# Altium footprint library Evaluation Board.PcbLib: 121 footprints (part 4 of 8)
Each footprint in its own frame and in the unit in brackets; x right, y up, seen from the top. Pads: shape width x height; smd on the part's side, far side on the other; paste and mask are expansions set on the pad; w line width, h text height; cw(c..) or ccw(c..) is an arc to the next point about the centre after c.
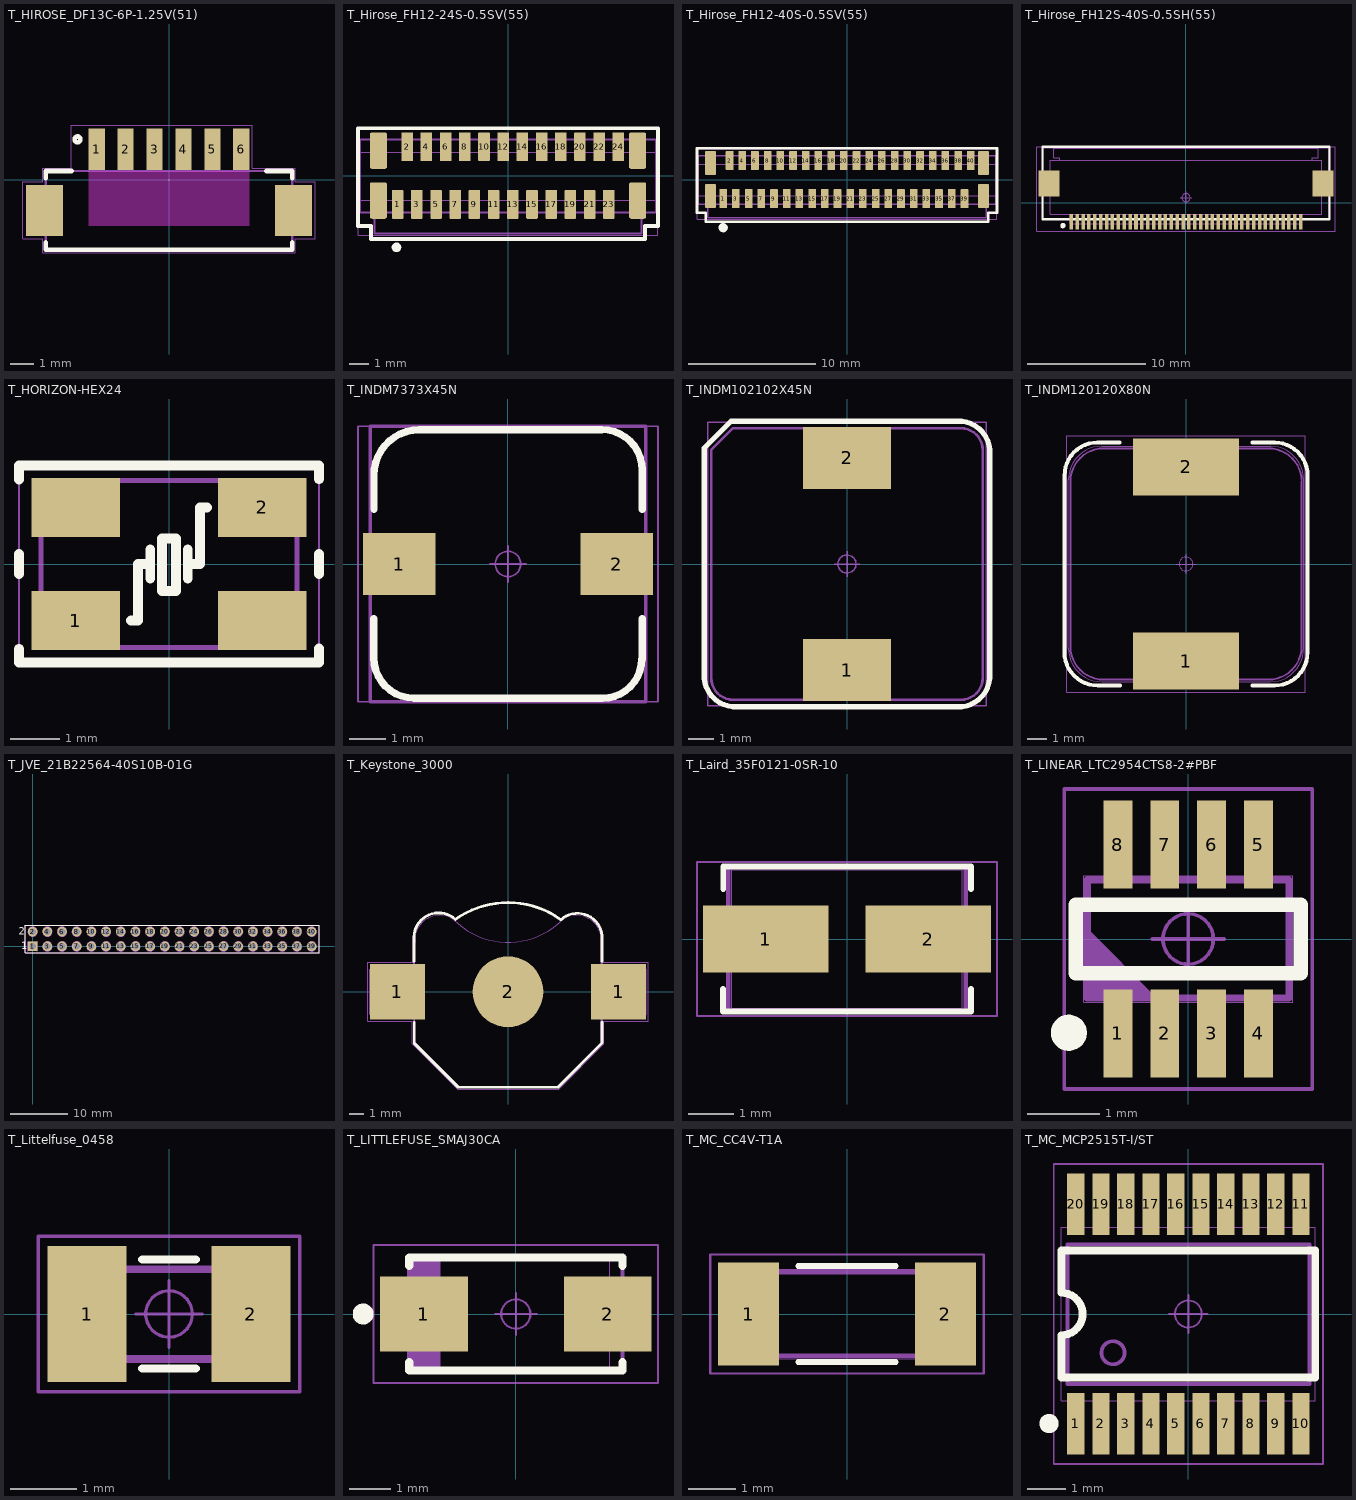
[diagram p3: the footprints below, top view; thin cyan lines are the x and y axes]

## T_HIROSE_DF13C-6P-1.25V(51) [mm] "Touch connector"
height 4.8
pads (8):
  rect 0.7x1.8 smd: 1(-3.125,1.324) 2(-1.875,1.324) 3(-0.625,1.324) 4(0.625,1.324) 5(1.875,1.324) 6(3.125,1.324)
  rect 1.6x2.2 smd: ""(-5.385,-1.324) ""(5.385,-1.324)
Top Overlay:
  circle w0.2: c-3.955,1.744 r0.125
  lines w0.2: -5.325,-2.713 -5.325,-3.024 5.325,-3.024 5.325,-2.713 ; -5.325,0.064 -5.325,0.376 -4.201,0.376 ; 4.201,0.376 5.325,0.376 5.325,0.064
Keep-Out Layer:
  rectangle: -3.475,-1.994 3.475,0.376
Mechanical 1:
  lines w0.05: -6.316,-2.555 -5.456,-2.555 -5.456,-3.155 5.456,-3.155 5.456,-2.555 6.316,-2.555 6.316,-0.093 5.456,-0.092 5.456,0.507 3.606,0.507 3.606,2.354 -4.226,2.354 -4.226,0.506 -5.456,0.506 -5.456,-0.093 -6.316,-0.093 -6.316,-2.555
Mechanical 2:
  lines w0.001: -5.325,-2.224 -6.075,-2.224 -6.075,-0.424 -5.325,-0.424 ; 5.325,-2.224 6.075,-2.224 6.075,-0.424 5.325,-0.424 ; -5.325,-3.024 5.325,-3.024 5.325,0.376 -5.325,0.376 -5.325,-3.024
Mechanical 3:
  lines w0.1: -5.325,-3.024 5.325,-3.024 5.325,0.376 -5.325,0.376 -5.325,-3.024

## T_Hirose_FH12-24S-0.5SV(55) [mm] "FFC Connector 0.5mm pitch Vertical"
height 5.5
pads (28):
  rrect12% 0.6x1.5 smd: 1(-5.75,-1.5) 2(-5.25,1.5) 3(-4.75,-1.5) 4(-4.25,1.5) 5(-3.75,-1.5) 6(-3.25,1.5) 7(-2.75,-1.5) 8(-2.25,1.5) 9(-1.75,-1.5) 10(-1.25,1.5) 11(-0.75,-1.5) 12(-0.25,1.5) 13(0.25,-1.5) 14(0.75,1.5) 15(1.25,-1.5) 16(1.75,1.5) 17(2.25,-1.5) 18(2.75,1.5) 19(3.25,-1.5) 20(3.75,1.5) 21(4.25,-1.5) 22(4.75,1.5) 23(5.25,-1.5) 24(5.75,1.5)
  rrect25% 0.9x1.9 smd: ""(-6.75,-1.3) ""(-6.75,1.3) ""(6.75,-1.3) ""(6.75,1.3)
Top Overlay:
  circle w0.25: c-5.81,-3.738 r0.125
  lines w0.2: -7.814,-2.625 -7.814,2.464 7.814,2.464 7.814,-2.625 7.132,-2.625 7.132,-3.307 -7.132,-3.307 -7.132,-2.625 -7.814,-2.625
Mechanical 1:
  lines w0.05: -7.8,-3.116 7.8,-3.116 7.8,2.416 -7.8,2.416 -7.8,-3.116
Mechanical 2:
  lines w0.001: -7.7,-1.275 7.7,-1.275 ; -7.7,1.225 7.7,1.225 ; -6.95,-1.925 -6.95,-3.025 6.95,-3.025 6.95,-1.925 ; -7.7,-1.925 7.7,-1.925 7.7,1.875 -7.7,1.875 -7.7,-1.925
Mechanical 3:
  lines w0.1: -6.95,-1.925 -6.95,-3.025 6.95,-3.025 6.95,-1.925 ; -7.7,-1.925 7.7,-1.925 7.7,1.875 -7.7,1.875 -7.7,-1.925
3D body "FH12-24S-0.5SV.stp": height 5.52, standoff 0.02, extent -7.7,-1.925 7.7,1.875

## T_Hirose_FH12-40S-0.5SV(55) [mm] "FFC Connector 0.5mm pitch Vertical"
height 5.5
pads (44):
  rrect12% 0.6x1.5 smd: 1(-9.75,-1.5) 2(-9.25,1.5) 3(-8.75,-1.5) 4(-8.25,1.5) 5(-7.75,-1.5) 6(-7.25,1.5) 7(-6.75,-1.5) 8(-6.25,1.5) 9(-5.75,-1.5) 10(-5.25,1.5) 11(-4.75,-1.5) 12(-4.25,1.5) 13(-3.75,-1.5) 14(-3.25,1.5) 15(-2.75,-1.5) 16(-2.25,1.5) 17(-1.75,-1.5) 18(-1.25,1.5) 19(-0.75,-1.5) 20(-0.25,1.5) 21(0.25,-1.5) 22(0.75,1.5) 23(1.25,-1.5) 24(1.75,1.5) 25(2.25,-1.5) 26(2.75,1.5) 27(3.25,-1.5) 28(3.75,1.5) 29(4.25,-1.5) 30(4.75,1.5) 31(5.25,-1.5) 32(5.75,1.5) 33(6.25,-1.5) 34(6.75,1.5) 35(7.25,-1.5) 36(7.75,1.5) 37(8.25,-1.5) 38(8.75,1.5) 39(9.25,-1.5) 40(9.75,1.5)
  rrect25% 0.9x1.9 smd: ""(-10.75,-1.3) ""(-10.75,1.3) ""(10.75,-1.3) ""(10.75,1.3)
Top Overlay:
  circle w0.4: c-9.75,-3.79 r0.16
  lines w0.2: 11.13,-3.307 -11.132,-3.307 -11.132,-2.625 -11.814,-2.625 -11.814,2.464 11.814,2.464 11.814,-2.625 11.132,-2.625 11.132,-3.307
Mechanical 1:
  lines w0.05: -11.8,-3.116 11.8,-3.116 11.8,2.416 -11.8,2.416 -11.8,-3.116
Mechanical 2:
  lines w0.001: -11.7,-1.275 11.7,-1.275 ; -11.7,1.225 11.7,1.225 ; -10.95,-1.925 -10.95,-3.025 10.95,-3.025 10.95,-1.925 ; -11.7,-1.925 11.7,-1.925 11.7,1.875 -11.7,1.875 -11.7,-1.925
Mechanical 3:
  lines w0.1: -10.95,-1.925 -10.95,-3.025 10.95,-3.025 10.95,-1.925 ; -11.7,-1.925 11.7,-1.925 11.7,1.875 -11.7,1.875 -11.7,-1.925
3D body "FH12-40S-0.5SV.stp": height 5.52, standoff 0.02, extent -11.7,-1.925 11.7,1.875

## T_Hirose_FH12S-40S-0.5SH(55) [mm] "DVI FFC Connector 0.5mm pitch"
height 2
pads (42):
  rect 0.3x1.3 smd: 1(-9.75,-1.625) 2(-9.25,-1.625) 3(-8.75,-1.625) 4(-8.25,-1.625) 5(-7.75,-1.625) 6(-7.25,-1.625) 7(-6.75,-1.625) 8(-6.25,-1.625) 9(-5.75,-1.625) 10(-5.25,-1.625) 11(-4.75,-1.625) 12(-4.25,-1.625) 13(-3.75,-1.625) 14(-3.25,-1.625) 15(-2.75,-1.625) 16(-2.25,-1.625) 17(-1.75,-1.625) 18(-1.25,-1.625) 19(-0.75,-1.625) 20(-0.25,-1.625) 21(0.25,-1.625) 22(0.75,-1.625) 23(1.25,-1.625) 24(1.75,-1.625) 25(2.25,-1.625) 26(2.75,-1.625) 27(3.25,-1.625) 28(3.75,-1.625) 29(4.25,-1.625) 30(4.75,-1.625) 31(5.25,-1.625) 32(5.75,-1.625) 33(6.25,-1.625) 34(6.75,-1.625) 35(7.25,-1.625) 36(7.75,-1.625) 37(8.25,-1.625) 38(8.75,-1.625) 39(9.25,-1.625) 40(9.75,-1.625)
  rect 1.8x2.2 smd: ""(-11.65,1.625) ""(11.65,1.625)
Top Overlay:
  circle w0.2: c-10.459,-1.944 r0.125
  lines w0.2: -12.198,-1.411 -12.198,4.755 12.193,4.755 12.193,-1.411 -12.198,-1.411
Mechanical 1:
  circle w0.05: c0,0.425 r0.35
  lines w0.05: -0.5,0.425 0.5,0.425 ; 0,-0.075 0,0.925 ; -12.69,-2.415 -12.69,4.755 12.69,4.755 12.69,-2.415 -12.69,-2.415
Mechanical 2:
  lines w0.001: -10.75,3.625 -10.75,3.825 -11.25,3.825 -11.25,4.625 11.25,4.625 11.25,3.825 10.75,3.825 10.75,3.625 ; -9.85,-0.975 -9.85,-1.775 9.85,-1.775 9.85,-0.975 ; -12.05,1.025 -12.05,2.225 -11.55,2.225 -11.55,3.625 11.55,3.625 11.55,2.225 12.05,2.225 12.05,1.025 11.55,1.025 11.55,-0.975 -11.55,-0.975 -11.55,1.025 -12.05,1.025
Mechanical 3:
  lines w0.1: -12.125,-1.336 -12.125,4.689 12.12,4.689 12.12,-1.336 -12.125,-1.336

## T_HORIZON-HEX24 [mm] "OSC"
height 0.9
pads (4):
  rect 1.8x1.2 smd: 1(-1.9,-1.15) 2(1.9,1.15) ""(-1.9,1.15) ""(1.9,-1.15)
Top Overlay:
  lines w0.2: -3.05,-1.722 -3.05,-2.001 3.05,-2.001 ; -3.05,-0.2 -3.05,0.2 ; -3.05,1.72 -3.05,1.999 ; -3.05,2.001 3.05,2.001 3.05,1.722 ; -0.77,-1.15 -0.63,-1.15 -0.63,0 -0.38,0 ; -0.38,-0.3 -0.38,0.3 ; 0.38,-0.3 0.38,0.3 ; 0.38,0 0.63,0 0.63,1.15 0.77,1.15 ; 3.05,-1.999 3.05,-1.72 ; 3.05,-0.2 3.05,0.2 ; -0.14,-0.55 -0.14,0.52 0.14,0.52 0.14,-0.55 -0.14,-0.55
Mechanical 1:
  lines w0.05: -3.05,-2.001 3.05,-2.001 3.05,2.001 -3.05,2.001 -3.05,-2.001
Mechanical 2:
  lines w0.001: -2.6,-1.7 2.6,-1.7 2.6,1.7 -2.6,1.7 -2.6,-1.7
Mechanical 3:
  lines w0.1: -2.6,-1.7 2.6,-1.7 2.6,1.7 -2.6,1.7 -2.6,-1.7
3D body: height 0.9, standoff 0, extent -2.6,-1.7 2.6,1.7

## T_INDM7373X45N [mm]
height 4.5
pads (2):
  rect 2x1.7 smd: 1(-3,0) 2(3,0)
Top Overlay:
  lines w0.2: -3.7,-1.5 -3.7,-2.59 ccw(c-2.594,-2.59) -2.594,-3.697 ; -3.696,1.5 -3.696,2.6 ; -3.696,2.452 cw(c-2.448,2.452) -2.448,3.7 2.588,3.7 ; -2.594,-3.7 2.609,-3.7 ccw(c2.609,-2.623) 3.686,-2.623 ; 2.588,3.708 cw(c2.588,2.596) 3.7,2.596 ; 3.7,-2.623 3.7,-1.5 ; 3.7,1.5 3.7,2.6
Mechanical 1:
  circle w0.05: c0,0 r0.35
  lines w0.05: -0.5,0 0.5,0 ; 0,-0.5 0,0.5 ; -4.135,-3.8 4.136,-3.8 4.136,3.8 -4.135,3.8 -4.135,-3.8
Mechanical 2:
  lines w0.001: -3.8,-3.8 3.8,-3.8 3.8,3.8 -3.8,3.8 -3.8,-3.8
Mechanical 3:
  lines w0.1: -3.8,-3.8 3.8,-3.8 3.8,3.8 -3.8,3.8 -3.8,-3.8

## T_INDM102102X45N [mm]
height 4.5
pads (2):
  rect 3.4x2.4 smd: 1(0,-4.1) 2(0,4.1)
Top Overlay:
  lines w0.2: 4.24,-5.52 ccw(c4.32,-4.32) 5.52,-4.4 5.52,4.4 ; 4.4,-5.52 -4.4,-5.52 cw(c-4.32,-4.32) -5.52,-4.24 -5.52,4.49 -4.49,5.52 4.24,5.52 cw(c4.32,4.32) 5.52,4.24
Mechanical 1:
  circle w0.05: c0,0 r0.35
  lines w0.05: -0.5,0 0.5,0 ; 0,-0.5 0,0.5 ; -5.38,-5.48 -5.38,5.48 5.38,5.48 5.38,-5.48 -5.38,-5.48
Mechanical 2:
  lines w0.001: -5.25,-4.4 ccw(c-4.4,-4.4) -4.4,-5.25 4.4,-5.25 ccw(c4.4,-4.4) 5.25,-4.4 5.25,4.4 ccw(c4.4,4.4) 4.4,5.25 -4.4,5.25 -5.25,4.4 -5.25,-4.4
Mechanical 3:
  lines w0.1: -5.25,-4.4 ccw(c-4.4,-4.4) -4.4,-5.25 4.4,-5.25 ccw(c4.4,-4.4) 5.25,-4.4 5.25,4.4 ccw(c4.4,4.4) 4.4,5.25 -4.4,5.25 -5.25,4.4 -5.25,-4.4
3D body: height 4.5, standoff 0, extent -5.25,-5.25 5.25,5.25

## T_INDM120120X80N [mm]
height 6
pads (2):
  rect 5.4x2.9 smd: 1(0,-4.95) 2(0,4.95)
Top Overlay:
  lines w0.2: -6.204,-4.492 ccw(c-4.496,-4.492) -4.496,-6.2 -3.373,-6.2 ; -6.2,-4.492 -6.2,4.516 ; -6.196,4.516 cw(c-4.513,4.516) -4.513,6.2 -3.39,6.2 ; 3.382,-6.2 4.505,-6.2 ccw(c4.505,-4.509) 6.196,-4.509 ; 3.393,6.196 4.516,6.196 cw(c4.516,4.512) 6.2,4.512 6.2,-4.509
Mechanical 1:
  circle w0.05: c0,0 r0.35
  lines w0.05: -0.5,0 0.5,0 ; 0,-0.5 0,0.5 ; -6.08,-6.535 -6.08,6.535 6.08,6.535 6.08,-6.535 -6.08,-6.535
Mechanical 2:
  lines w0.001: -6,-4.299 ccw(c-4.299,-4.299) -4.3,-6 ; -6,4.3 cw(c-4.299,4.299) -4.299,6 ; -6,-4.302 -6,4.303 ; -4.303,6 4.322,6 ; -4.302,-6 4.304,-6 ; 4.299,-6 ccw(c4.299,-4.299) 6,-4.3 ; 4.3,6 cw(c4.299,4.299) 6,4.299 ; 6,-4.313 6,4.322
Mechanical 3:
  lines w0.1: -5.901,-4.198 ccw(c-4.2,-4.198) -4.201,-5.899 ; -5.9,-4.21 -5.9,4.2 ; -5.899,4.201 cw(c-4.198,4.2) -4.198,5.901 ; -4.21,-5.9 4.21,-5.9 ; -4.2,5.9 4.2,5.9 ; 4.198,-5.901 ccw(c4.198,-4.2) 5.899,-4.201 ; 4.201,5.899 cw(c4.2,4.198) 5.901,4.198 ; 5.9,-4.21 5.9,4.2
3D body: height 6, standoff 0, extent -6,-6 6,6

## T_JVE_21B22564-40S10B-01G [mm] "Header 2x20"
height 8.6
pads (40):
  rect 1.65x1.65 hole 1.15: 1(0,0)
  round 1.65 hole 1.15: 2(0,2.54) 3(2.54,0) 4(2.54,2.54) 5(5.08,0) 6(5.08,2.54) 7(7.62,0) 8(7.62,2.54) 9(10.16,0) 10(10.16,2.54) 11(12.7,0) 12(12.7,2.54) 13(15.24,0) 14(15.24,2.54) 15(17.78,0) 16(17.78,2.54) 17(20.32,0) 18(20.32,2.54) 19(22.86,0) 20(22.86,2.54) 21(25.4,0) 22(25.4,2.54) 23(27.94,0) 24(27.94,2.54) 25(30.48,0) 26(30.48,2.54) 27(33.02,0) 28(33.02,2.54) 29(35.56,0) 30(35.56,2.54) 31(38.1,0) 32(38.1,2.54) 33(40.64,0) 34(40.64,2.54) 35(43.18,0) 36(43.18,2.54) 37(45.72,0) 38(45.72,2.54) 39(48.26,0) 40(48.26,2.54)
Top Overlay:
  lines w0.2: -1.27,-1.14 49.53,-1.14 49.53,3.68 -1.27,3.68 -1.27,-1.137
  text "1" at -1.941,-0.522 h1.27
  text "2" at -2.364,2.048 h1.27
Mechanical 1:
  circle w0.05: c0,0 r0.35
  lines w0.05: -1.27,-1.14 49.53,-1.14 49.53,3.68 -1.27,3.68 -1.27,-1.137 ; -0.5,0 0.5,0 ; 0,-0.5 0,0.5
Mechanical 2:
  lines w0.001: -1.27,-1.14 -1.27,3.68 49.53,3.68 49.53,-1.14 -1.27,-1.14
Mechanical 3:
  circle w0.1: c48.26,2.54 r0.825
  circle w0.1: c48.26,0 r0.825
  circle w0.1: c45.72,2.54 r0.825
  circle w0.1: c45.72,0 r0.825
  circle w0.1: c43.18,2.54 r0.825
  circle w0.1: c43.18,0 r0.825
  circle w0.1: c40.64,2.54 r0.825
  circle w0.1: c40.64,0 r0.825
  circle w0.1: c38.1,2.54 r0.825
  circle w0.1: c38.1,0 r0.825
  circle w0.1: c35.56,2.54 r0.825
  circle w0.1: c35.56,0 r0.825
  circle w0.1: c33.02,2.54 r0.825
  circle w0.1: c33.02,0 r0.825
  circle w0.1: c30.48,2.54 r0.825
  circle w0.1: c30.48,0 r0.825
  circle w0.1: c27.94,2.54 r0.825
  circle w0.1: c27.94,0 r0.825
  circle w0.1: c25.4,2.54 r0.825
  circle w0.1: c25.4,0 r0.825
  circle w0.1: c22.86,2.54 r0.825
  circle w0.1: c22.86,0 r0.825
  circle w0.1: c20.32,2.54 r0.825
  circle w0.1: c20.32,0 r0.825
  circle w0.1: c17.78,2.54 r0.825
  circle w0.1: c17.78,0 r0.825
  circle w0.1: c15.24,2.54 r0.825
  circle w0.1: c15.24,0 r0.825
  circle w0.1: c12.7,2.54 r0.825
  circle w0.1: c12.7,0 r0.825
  circle w0.1: c10.16,2.54 r0.825
  circle w0.1: c10.16,0 r0.825
  circle w0.1: c7.62,2.54 r0.825
  circle w0.1: c7.62,0 r0.825
  circle w0.1: c5.08,2.54 r0.825
  circle w0.1: c5.08,0 r0.825
  circle w0.1: c2.54,2.54 r0.825
  circle w0.1: c2.54,0 r0.825
  circle w0.1: c0,2.54 r0.825
  lines w0.1: -1.27,-1.14 49.53,-1.14 49.53,3.68 -1.27,3.68 -1.27,-1.137 ; -0.825,-0.825 -0.825,0.825 0.825,0.825 0.825,-0.825

## T_Keystone_3000 [mm] "Battery Holder"
height 3.2
pads (3):
  rect 3.9x3.9 smd: 1(-7.82,0) 1(7.82,0)
  round 5 smd mask+0: 2(0,0)
Top Overlay:
  lines w0.2: -6.653,2.153 -6.653,3.928 ; -6.653,3.668 cw(c-4.903,3.818) -3.718,5.115 ; -6.631,-2.152 -6.631,-3.638 -3.517,-6.752 3.523,-6.752 6.651,-3.624 6.651,-2.152 ; -3.716,5.117 cw(c0,-0.1) 3.736,5.103 ; 3.736,5.102 cw(c4.906,3.792) 6.654,3.965 6.654,2.152
Mechanical 1:
  lines w0.05: -6.697,3.669 cw(c-4.947,3.819) -3.753,5.107 ; -6.697,3.972 -6.697,2.091 -9.911,2.091 -9.911,-2.09 -6.757,-2.09 -6.757,-3.642 -6.757,-3.691 -3.57,-6.878 3.574,-6.878 6.776,-3.676 6.776,-2.091 8.247,-2.091 9.91,-2.091 9.91,2.091 6.689,2.091 6.689,4 ; -3.745,5.096 cw(c0,-0.1) 3.756,5.088 ; 3.765,5.102 cw(c4.939,3.795) 6.689,3.645
Mechanical 2:
  circle w0.001: c8.185,0 r1.2
  circle w0.001: c-8.185,0 r1.2
  lines w0.001: -6.6,-1.6 -9.77,-1.6 -9.77,1.6 -6.6,1.6 ; -3.802,5.055 cw(c0,-0.1) 3.803,5.054 ; 6.6,-1.6 9.77,-1.6 9.77,1.6 6.6,1.6 ; -6.6,-3.6 -3.5,-6.7 3.5,-6.7 6.6,-3.6 6.6,-3.5 6.6,3.5 ccw(c4.85,3.65) 3.837,5.085 cw(c0.001,8.915) -3.83,5.08 ccw(c-4.85,3.65) -6.6,3.5 -6.6,-3.5 -6.6,-3.6
Mechanical 3:
  lines w0.1: -6.653,3.668 cw(c-4.903,3.818) -3.709,5.106 ; -6.653,3.928 -6.653,1.727 ; -6.635,-3.635 -3.517,-6.752 3.523,-6.752 6.589,-3.679 ; -6.631,-3.638 -6.631,-1.723 ; -3.745,5.096 cw(c0,-0.1) 3.756,5.088 ; 3.733,5.098 cw(c4.906,3.792) 6.654,3.965 6.654,1.73 9.575,1.73 9.575,-1.724 8.47,-1.724 6.651,-1.724 6.651,-3.623 ; -9.578,-1.723 -9.578,1.727 ; -9.578,-1.723 -6.631,-1.723 ; -9.578,-1.723 -6.631,-1.723 ; -9.578,-1.723 -9.578,1.727 ; -9.578,1.727 -6.653,1.727 ; -9.578,1.727 -6.653,1.727

## T_Laird_35F0121-0SR-10 [mm] "Power supply FB 10A"
height 3.05
pads (2):
  rect 2.77x1.47 smd: 1(-1.79,0) 2(1.79,0)
Top Overlay:
  lines w0.127: -2.732,-1.102 -2.732,-1.599 2.73,-1.599 2.73,-1.104 ; -2.729,1.104 -2.729,1.599 2.73,1.599 2.73,1.104
Mechanical 1:
  lines w0.05: -3.306,-1.695 -3.306,1.695 3.305,1.695 3.305,-1.695 -3.306,-1.695
Mechanical 2:
  lines w0.001: -2.54,-1.525 -2.54,1.525 2.54,1.525 2.54,-1.525 -2.54,-1.525
Mechanical 3:
  lines w0.1: -2.614,-1.599 2.614,-1.599 2.614,1.599 -2.614,1.599 -2.614,-1.599
3D body: height 3.05, standoff 0, extent -2.54,-1.525 2.54,1.525

## T_LINEAR_LTC2954CTS8-2#PBF [mm]
height 1
pads (8):
  rect 0.4x1.22 smd: 1(-0.975,-1.31) 2(-0.325,-1.31) 3(0.325,-1.31) 4(0.975,-1.31) 5(0.975,1.31) 6(0.325,1.31) 7(-0.325,1.31) 8(-0.975,1.31)
Top Overlay:
  circle w0.25: c-1.655,-1.3 r0.125
  lines w0.2: -1.56,-0.475 1.56,-0.475 1.56,0.475 -1.56,0.475 -1.56,-0.475
Mechanical 1:
  circle w0.05: c0,0 r0.35
  lines w0.05: -1.72,-2.08 1.72,-2.08 ; -1.72,-2.07 -1.72,2.08 1.72,2.08 1.72,-2.07 ; -0.5,0 0.5,0 ; 0,-0.5 0,0.5
Mechanical 2:
  lines w0.001: -1.45,-0.875 -1.45,0.875 1.45,0.875 1.45,-0.875 -1.45,-0.875
Mechanical 3:
  lines w0.1: -1.4,-0.72 -1.3,-0.82 ; -1.4,-0.62 -1.2,-0.82 ; -1.4,-0.52 -1.1,-0.82 ; -1.4,-0.42 -1,-0.82 ; -1.4,-0.32 -0.9,-0.82 ; -1.4,-0.22 -0.8,-0.82 ; -1.4,-0.12 -0.7,-0.82 ; -1.4,-0.02 -0.6,-0.82 ; -1.4,0.08 -0.5,-0.82 ; -1.4,-0.82 1.4,-0.82 1.4,0.82 -1.4,0.82 -1.4,-0.82
3D body: height 1, standoff 0, extent -1.45,-0.875 1.45,0.875

## T_Littelfuse_0458 [mm] "Fast Fuse"
height 1.575
pads (2):
  rect 1.185x2.05 smd: 1(-1.232,0) 2(1.232,0)
Top Overlay:
  lines w0.127: -0.4,-0.82 0.4,-0.82 ; -0.4,0.82 0.4,0.82
Mechanical 1:
  circle w0.05: c0,0 r0.35
  lines w0.05: -0.5,0 0.5,0 ; 0,-0.5 0,0.5 ; -1.97,-1.17 1.97,-1.17 1.97,1.17 -1.97,1.17 -1.97,-1.17
Mechanical 2:
  lines w0.001: -1.587,-0.725 1.587,-0.725 1.587,0.725 -1.587,0.725 -1.587,-0.725
Mechanical 3:
  lines w0.1: -1.53,-0.67 1.53,-0.67 1.53,0.67 -1.53,0.67 -1.53,-0.67

## T_LITTLEFUSE_SMAJ30CA [mm] "Bidirectional ESD protection"
height 2.29
pads (2):
  rect 2.1x1.8 smd: 1(-2.2,0) 2(2.2,0)
Top Overlay:
  circle w0.25: c-3.65,0 r0.125
  lines w0.2: -2.55,-1.15 -2.55,-1.35 2.55,-1.35 2.55,-1.15 ; -2.55,1.15 -2.55,1.35 2.55,1.35 2.55,1.15
Mechanical 1:
  circle w0.05: c0,0 r0.35
  lines w0.05: -0.5,0 0.5,0 ; 0,-0.5 0,0.5 ; -3.4,-1.65 3.4,-1.65 3.4,1.65 -3.4,1.65 -3.4,-1.65
Mechanical 2:
  lines w0.001: -2.25,-1.395 2.25,-1.395 2.25,1.395 -2.25,1.395 -2.25,-1.395
Mechanical 3:
  lines w0.1: -2.452,-1.332 -2.452,1.332 ; -2.352,-1.332 -2.352,1.332 ; -2.252,-1.332 -2.252,1.332 ; -2.152,-1.332 -2.152,1.332 ; -2.052,-1.332 -2.052,1.332 ; -1.952,-1.332 -1.952,1.332 ; -1.852,-1.332 -1.852,1.332 ; -2.552,-1.332 2.552,-1.332 2.552,1.332 -2.552,1.332 ; -2.552,-1.332 -2.552,1.332 ; -2.552,-1.332 -2.552,1.332
3D body: height 2.29, standoff 0, extent -2.25,-1.395 2.25,1.395

## T_MC_CC4V-T1A [mm]
height 0.9
pads (2):
  rect 1.3x2.2 smd: 1(-2.1,0) 2(2.1,0)
Top Overlay:
  lines w0.127: -1.04,-1.02 1.04,-1.02 ; -1.04,1.02 1.04,1.02
Mechanical 1:
  lines w0.05: -2.92,-1.27 2.92,-1.27 2.92,1.27 -2.92,1.27 -2.92,-1.27
Mechanical 2:
  lines w0.001: -2.5,-0.95 2.5,-0.95 2.5,0.95 -2.5,0.95 -2.5,-0.95
Mechanical 3:
  lines w0.1: -2.44,-0.89 -2.44,0.89 2.44,0.89 2.44,-0.89 -2.44,-0.89
3D body: height 2.29, standoff 0, extent -2.5,-0.95 2.5,0.95

## T_MC_MCP2515T-I/ST [mm] "TSSOP20"
height 1.2
pads (20):
  rect 0.45x1.6 smd: 1(-2.925,-2.85) 2(-2.275,-2.85) 3(-1.625,-2.85) 4(-0.975,-2.85) 5(-0.325,-2.85) 6(0.325,-2.85) 7(0.975,-2.85) 8(1.625,-2.85) 9(2.275,-2.85) 10(2.925,-2.85) 11(2.925,2.85) 12(2.275,2.85) 13(1.625,2.85) 14(0.975,2.85) 15(0.325,2.85) 16(-0.325,2.85) 17(-0.975,2.85) 18(-1.625,2.85) 19(-2.275,2.85) 20(-2.925,2.85)
Top Overlay:
  circle w0.25: c-3.625,-2.85 r0.125
  lines w0.2: -3.3,-1.65 -3.3,-0.55 ccw(c-3.3,0) -3.3,0.55 -3.3,1.65 3.3,1.65 3.3,-1.65 -3.3,-1.65
Mechanical 1:
  circle w0.05: c0,0 r0.35
  lines w0.05: -0.5,0 0.5,0 ; 0,-0.5 0,0.5 ; -3.5,-3.9 -3.5,3.9 3.5,3.9 3.5,-3.9 -3.5,-3.9
Mechanical 2:
  lines w0.001: -3.3,-2.25 -3.3,2.25 3.3,2.25 3.3,-2.25 -3.3,-2.25
Mechanical 3:
  circle w0.1: c-1.961,-1.008 r0.3
  lines w0.1: -3.143,-1.817 -3.143,1.815 3.147,1.815 3.147,-1.817 -3.143,-1.817
3D body: height 1.2, standoff 0, extent -3.3,-2.25 3.3,2.25